# Altium footprint library PcbLib.PcbLib: 13 footprints
Each footprint in its own frame and in the unit in brackets; x right, y up, seen from the top. Pads: shape width x height; smd on the part's side, far side on the other; paste and mask are expansions set on the pad; w line width, h text height; cw(c..) or ccw(c..) is an arc to the next point about the centre after c.
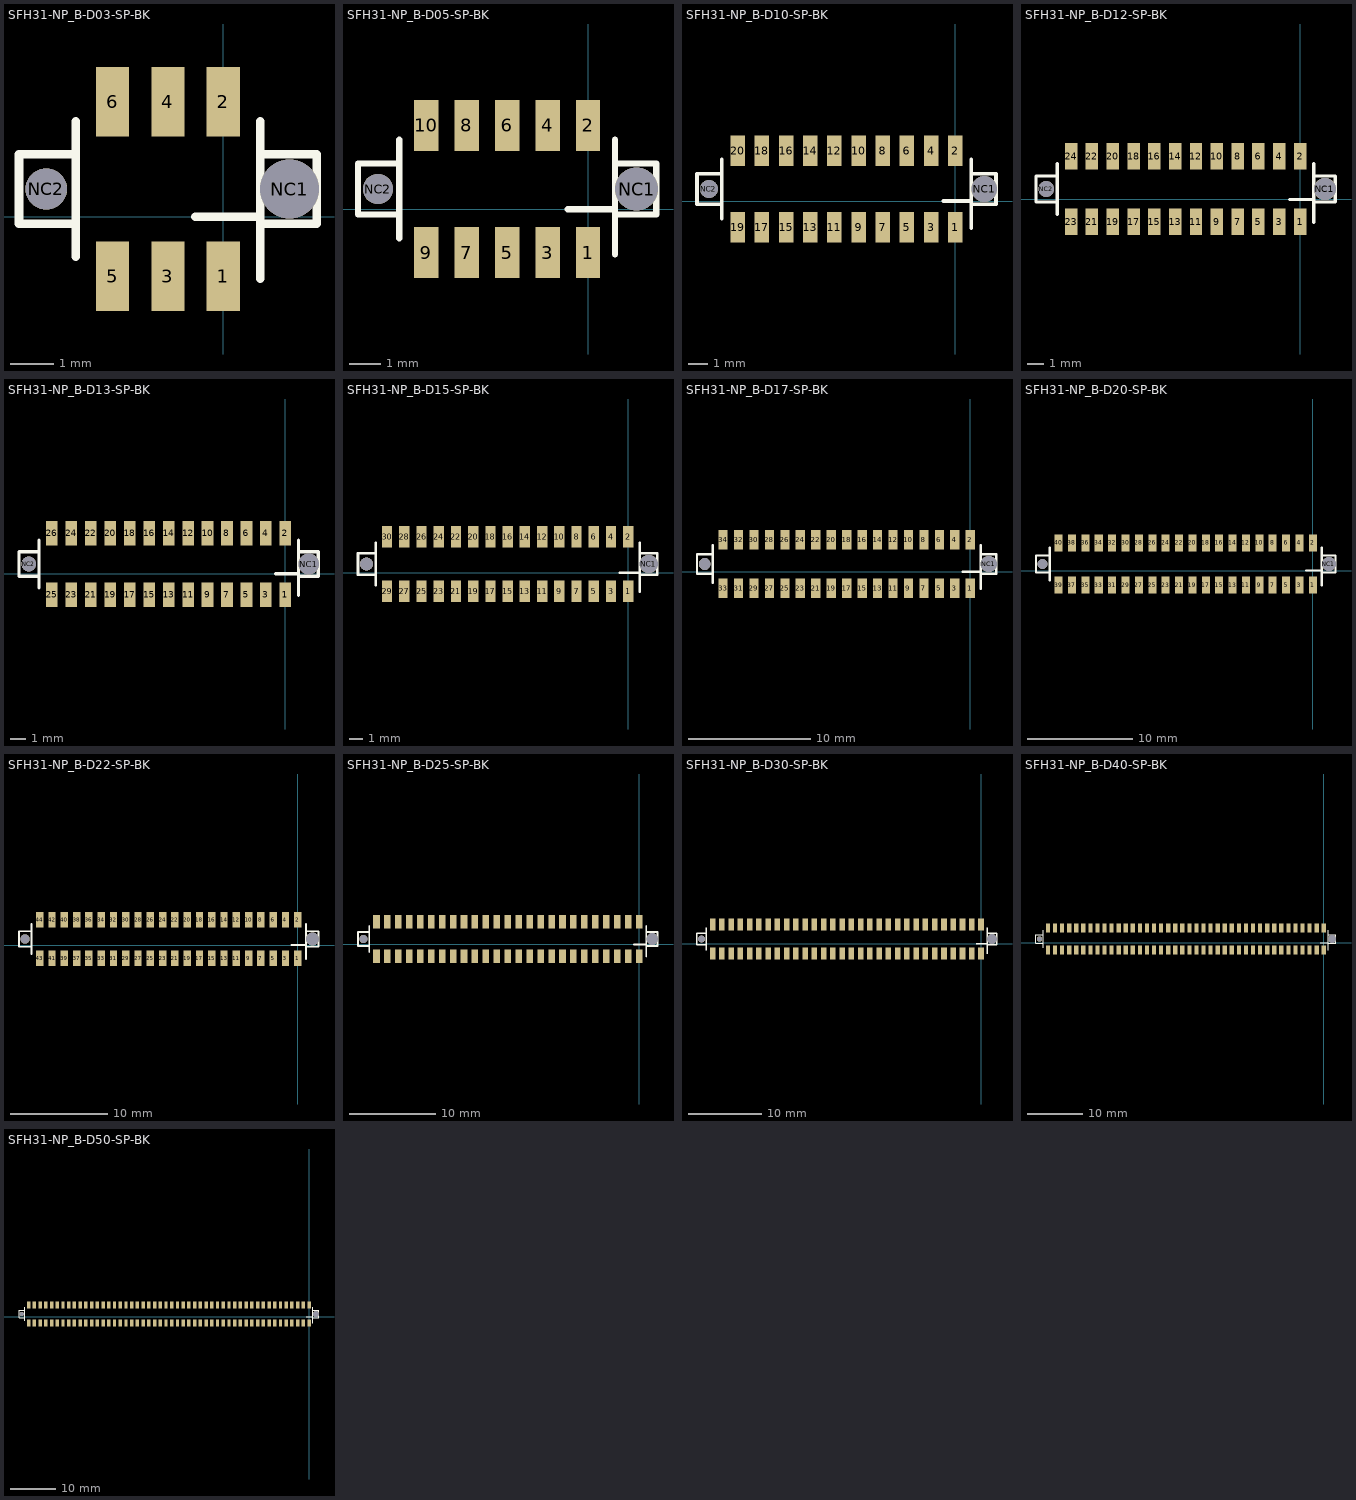
[diagram p0: the footprints below, top view; thin cyan lines are the x and y axes]

## SFH31-NP_B-D03-SP-BK [mm] "1.27mm SMT Female Header with Guide Posts & Polarizing Key"
height 4.4
pads (8):
  rect 0.76x1.6 smd: 1(0,-1.365) 2(0,2.635) 3(-1.27,-1.365) 4(-1.27,2.635) 5(-2.54,-1.365) 6(-2.54,2.635)
  round 1.35 hole 1.35 mask+0: NC1(1.52,0.635)
  round 0.95 hole 0.95 mask+0: NC2(-4.06,0.635)
via 1.52,0.635 diameter 1.35 hole 1.35
via -4.06,0.635 diameter 0.95 hole 0.95
Top Overlay:
  lines w0.2: -3.385,-0.915 -3.385,2.185 ; -3.385,-0.165 -4.685,-0.165 -4.685,1.435 -3.385,1.435 ; -0.635,0 0.845,0 ; 0.845,-1.415 0.845,2.185 ; 0.845,-0.165 2.145,-0.165 2.145,1.435 0.845,1.435
3D body "SFH31-_ _ _B-D03-SP-_ _.STEP": height 4.4, standoff -1, extent -4.715,-1.614 2.145,2.884

## SFH31-NP_B-D05-SP-BK [mm] "1.27mm SMT Female Header with Guide Posts & Polarizing Key"
height 4.4
pads (12):
  rect 0.76x1.6 smd: 1(0,-1.365) 2(0,2.635) 3(-1.27,-1.365) 4(-1.27,2.635) 5(-2.54,-1.365) 6(-2.54,2.635) 7(-3.81,-1.365) 8(-3.81,2.635) 9(-5.08,-1.365) 10(-5.08,2.635)
  round 1.35 hole 1.35 mask+0: NC1(1.52,0.635)
  round 0.95 hole 0.95 mask+0: NC2(-6.6,0.635)
via -6.6,0.635 diameter 0.95 hole 0.95
via 1.52,0.635 diameter 1.35 hole 1.35
Top Overlay:
  lines w0.2: -5.925,-0.915 -5.925,2.185 ; -5.925,-0.165 -7.225,-0.165 -7.225,1.435 -5.925,1.435 ; -0.635,0 0.845,0 ; 0.845,-1.415 0.845,2.185 ; 0.845,-0.165 2.145,-0.165 2.145,1.435 0.845,1.435

## SFH31-NP_B-D10-SP-BK [mm] "1.27mm SMT Female Header with Guide Posts & Polarizing Key"
height 4.4
pads (22):
  rect 0.76x1.6 smd: 1(0,-1.365) 2(0,2.635) 3(-1.27,-1.365) 4(-1.27,2.635) 5(-2.54,-1.365) 6(-2.54,2.635) 7(-3.81,-1.365) 8(-3.81,2.635) 9(-5.08,-1.365) 10(-5.08,2.635) 11(-6.35,-1.365) 12(-6.35,2.635) 13(-7.62,-1.365) 14(-7.62,2.635) 15(-8.89,-1.365) 16(-8.89,2.635) 17(-10.16,-1.365) 18(-10.16,2.635) 19(-11.43,-1.365) 20(-11.43,2.635)
  round 1.35 hole 1.35 mask+0: NC1(1.52,0.635)
  round 0.95 hole 0.95 mask+0: NC2(-12.95,0.635)
via -12.95,0.635 diameter 0.95 hole 0.95
via 1.52,0.635 diameter 1.35 hole 1.35
Top Overlay:
  lines w0.2: -12.275,-0.915 -12.275,2.185 ; -12.275,-0.165 -13.575,-0.165 -13.575,1.435 -12.275,1.435 ; -0.635,0 0.845,0 ; 0.845,-1.415 0.845,2.185 ; 0.845,-0.165 2.145,-0.165 2.145,1.435 0.845,1.435

## SFH31-NP_B-D12-SP-BK [mm] "1.27mm SMT Female Header with Guide Posts & Polarizing Key"
height 4.4
pads (26):
  rect 0.76x1.6 smd: 1(0,-1.365) 2(0,2.635) 3(-1.27,-1.365) 4(-1.27,2.635) 5(-2.54,-1.365) 6(-2.54,2.635) 7(-3.81,-1.365) 8(-3.81,2.635) 9(-5.08,-1.365) 10(-5.08,2.635) 11(-6.35,-1.365) 12(-6.35,2.635) 13(-7.62,-1.365) 14(-7.62,2.635) 15(-8.89,-1.365) 16(-8.89,2.635) 17(-10.16,-1.365) 18(-10.16,2.635) 19(-11.43,-1.365) 20(-11.43,2.635) 21(-12.7,-1.365) 22(-12.7,2.635) 23(-13.97,-1.365) 24(-13.97,2.635)
  round 1.35 hole 1.35 mask+0: NC1(1.52,0.635)
  round 0.95 hole 0.95 mask+0: NC2(-15.49,0.635)
via -15.49,0.635 diameter 0.95 hole 0.95
via 1.52,0.635 diameter 1.35 hole 1.35
Top Overlay:
  lines w0.2: -14.815,-0.915 -14.815,2.185 ; -14.815,-0.165 -16.115,-0.165 -16.115,1.435 -14.815,1.435 ; -0.635,0 0.845,0 ; 0.845,-1.415 0.845,2.185 ; 0.845,-0.165 2.145,-0.165 2.145,1.435 0.845,1.435

## SFH31-NP_B-D13-SP-BK [mm] "1.27mm SMT Female Header with Guide Posts & Polarizing Key"
height 4.4
pads (28):
  rect 0.76x1.6 smd: 1(0,-1.365) 2(0,2.635) 3(-1.27,-1.365) 4(-1.27,2.635) 5(-2.54,-1.365) 6(-2.54,2.635) 7(-3.81,-1.365) 8(-3.81,2.635) 9(-5.08,-1.365) 10(-5.08,2.635) 11(-6.35,-1.365) 12(-6.35,2.635) 13(-7.62,-1.365) 14(-7.62,2.635) 15(-8.89,-1.365) 16(-8.89,2.635) 17(-10.16,-1.365) 18(-10.16,2.635) 19(-11.43,-1.365) 20(-11.43,2.635) 21(-12.7,-1.365) 22(-12.7,2.635) 23(-13.97,-1.365) 24(-13.97,2.635) 25(-15.24,-1.365) 26(-15.24,2.635)
  round 1.35 hole 1.35 mask+0: NC1(1.52,0.635)
  round 0.95 hole 0.95 mask+0: NC2(-16.76,0.635)
via 1.52,0.635 diameter 1.35 hole 1.35
via -16.76,0.635 diameter 0.95 hole 0.95
Top Overlay:
  lines w0.2: -16.085,-0.915 -16.085,2.185 ; -16.085,-0.165 -17.385,-0.165 -17.385,1.435 -16.085,1.435 ; -0.635,0 0.845,0 ; 0.845,-1.415 0.845,2.185 ; 0.845,-0.165 2.145,-0.165 2.145,1.435 0.845,1.435
3D body "SFH31-_ _ _B-D13-SP-_ _.STEP": height 4.4, standoff -1, extent -17.415,-1.614 2.145,2.884

## SFH31-NP_B-D15-SP-BK [mm] "1.27mm SMT Female Header with Guide Posts & Polarizing Key"
height 4.4
pads (32):
  rect 0.76x1.6 smd: 1(0,-1.365) 2(0,2.635) 3(-1.27,-1.365) 4(-1.27,2.635) 5(-2.54,-1.365) 6(-2.54,2.635) 7(-3.81,-1.365) 8(-3.81,2.635) 9(-5.08,-1.365) 10(-5.08,2.635) 11(-6.35,-1.365) 12(-6.35,2.635) 13(-7.62,-1.365) 14(-7.62,2.635) 15(-8.89,-1.365) 16(-8.89,2.635) 17(-10.16,-1.365) 18(-10.16,2.635) 19(-11.43,-1.365) 20(-11.43,2.635) 21(-12.7,-1.365) 22(-12.7,2.635) 23(-13.97,-1.365) 24(-13.97,2.635) 25(-15.24,-1.365) 26(-15.24,2.635) 27(-16.51,-1.365) 28(-16.51,2.635) 29(-17.78,-1.365) 30(-17.78,2.635)
  round 1.35 hole 1.35 mask+0: NC1(1.52,0.635)
  round 0.95 hole 0.95 mask+0: NC2(-19.3,0.635)
via 1.52,0.635 diameter 1.35 hole 1.35
via -19.3,0.635 diameter 0.95 hole 0.95
Top Overlay:
  lines w0.2: -18.625,-0.915 -18.625,2.185 ; -18.625,-0.165 -19.925,-0.165 -19.925,1.435 -18.625,1.435 ; -0.635,0 0.845,0 ; 0.845,-1.415 0.845,2.185 ; 0.845,-0.165 2.145,-0.165 2.145,1.435 0.845,1.435

## SFH31-NP_B-D17-SP-BK [mm] "1.27mm SMT Female Header with Guide Posts & Polarizing Key"
height 4.4
pads (36):
  rect 0.76x1.6 smd: 1(0,-1.365) 2(0,2.635) 3(-1.27,-1.365) 4(-1.27,2.635) 5(-2.54,-1.365) 6(-2.54,2.635) 7(-3.81,-1.365) 8(-3.81,2.635) 9(-5.08,-1.365) 10(-5.08,2.635) 11(-6.35,-1.365) 12(-6.35,2.635) 13(-7.62,-1.365) 14(-7.62,2.635) 15(-8.89,-1.365) 16(-8.89,2.635) 17(-10.16,-1.365) 18(-10.16,2.635) 19(-11.43,-1.365) 20(-11.43,2.635) 21(-12.7,-1.365) 22(-12.7,2.635) 23(-13.97,-1.365) 24(-13.97,2.635) 25(-15.24,-1.365) 26(-15.24,2.635) 27(-16.51,-1.365) 28(-16.51,2.635) 29(-17.78,-1.365) 30(-17.78,2.635) 31(-19.05,-1.365) 32(-19.05,2.635) 33(-20.32,-1.365) 34(-20.32,2.635)
  round 1.35 hole 1.35 mask+0: NC1(1.52,0.635)
  round 0.95 hole 0.95 mask+0: NC2(-21.84,0.635)
via -21.84,0.635 diameter 0.95 hole 0.95
via 1.52,0.635 diameter 1.35 hole 1.35
Top Overlay:
  lines w0.2: -21.165,-0.915 -21.165,2.185 ; -21.165,-0.165 -22.465,-0.165 -22.465,1.435 -21.165,1.435 ; -0.635,0 0.845,0 ; 0.845,-1.415 0.845,2.185 ; 0.845,-0.165 2.145,-0.165 2.145,1.435 0.845,1.435
3D body "SFH31-_ _ _B-D17-SP-_ _.STEP": height 4.4, standoff -1, extent -22.495,-1.614 2.145,2.884

## SFH31-NP_B-D20-SP-BK [mm] "1.27mm SMT Female Header with Guide Posts & Polarizing Key"
height 4.4
pads (42):
  rect 0.76x1.6 smd: 1(0,-1.365) 2(0,2.635) 3(-1.27,-1.365) 4(-1.27,2.635) 5(-2.54,-1.365) 6(-2.54,2.635) 7(-3.81,-1.365) 8(-3.81,2.635) 9(-5.08,-1.365) 10(-5.08,2.635) 11(-6.35,-1.365) 12(-6.35,2.635) 13(-7.62,-1.365) 14(-7.62,2.635) 15(-8.89,-1.365) 16(-8.89,2.635) 17(-10.16,-1.365) 18(-10.16,2.635) 19(-11.43,-1.365) 20(-11.43,2.635) 21(-12.7,-1.365) 22(-12.7,2.635) 23(-13.97,-1.365) 24(-13.97,2.635) 25(-15.24,-1.365) 26(-15.24,2.635) 27(-16.51,-1.365) 28(-16.51,2.635) 29(-17.78,-1.365) 30(-17.78,2.635) 31(-19.05,-1.365) 32(-19.05,2.635) 33(-20.32,-1.365) 34(-20.32,2.635) 35(-21.59,-1.365) 36(-21.59,2.635) 37(-22.86,-1.365) 38(-22.86,2.635) 39(-24.13,-1.365) 40(-24.13,2.635)
  round 1.35 hole 1.35 mask+0: NC1(1.52,0.635)
  round 0.95 hole 0.95 mask+0: NC2(-25.65,0.635)
via 1.52,0.635 diameter 1.35 hole 1.35
via -25.65,0.635 diameter 0.95 hole 0.95
Top Overlay:
  lines w0.2: -24.975,-0.915 -24.975,2.185 ; -24.975,-0.165 -26.275,-0.165 -26.275,1.435 -24.975,1.435 ; -0.635,0 0.845,0 ; 0.845,-1.415 0.845,2.185 ; 0.845,-0.165 2.145,-0.165 2.145,1.435 0.845,1.435

## SFH31-NP_B-D22-SP-BK [mm] "1.27mm SMT Female Header with Guide Posts & Polarizing Key"
height 4.4
pads (46):
  rect 0.76x1.6 smd: 1(0,-1.365) 2(0,2.635) 3(-1.27,-1.365) 4(-1.27,2.635) 5(-2.54,-1.365) 6(-2.54,2.635) 7(-3.81,-1.365) 8(-3.81,2.635) 9(-5.08,-1.365) 10(-5.08,2.635) 11(-6.35,-1.365) 12(-6.35,2.635) 13(-7.62,-1.365) 14(-7.62,2.635) 15(-8.89,-1.365) 16(-8.89,2.635) 17(-10.16,-1.365) 18(-10.16,2.635) 19(-11.43,-1.365) 20(-11.43,2.635) 21(-12.7,-1.365) 22(-12.7,2.635) 23(-13.97,-1.365) 24(-13.97,2.635) 25(-15.24,-1.365) 26(-15.24,2.635) 27(-16.51,-1.365) 28(-16.51,2.635) 29(-17.78,-1.365) 30(-17.78,2.635) 31(-19.05,-1.365) 32(-19.05,2.635) 33(-20.32,-1.365) 34(-20.32,2.635) 35(-21.59,-1.365) 36(-21.59,2.635) 37(-22.86,-1.365) 38(-22.86,2.635) 39(-24.13,-1.365) 40(-24.13,2.635) 41(-25.4,-1.365) 42(-25.4,2.635) 43(-26.67,-1.365) 44(-26.67,2.635)
  round 1.35 hole 1.35 mask+0: NC1(1.52,0.635)
  round 0.95 hole 0.95 mask+0: NC2(-28.19,0.635)
via 1.52,0.635 diameter 1.35 hole 1.35
via -28.19,0.635 diameter 0.95 hole 0.95
Top Overlay:
  lines w0.2: -27.515,-0.915 -27.515,2.185 ; -27.515,-0.165 -28.815,-0.165 -28.815,1.435 -27.515,1.435 ; -0.635,0 0.845,0 ; 0.845,-1.415 0.845,2.185 ; 0.845,-0.165 2.145,-0.165 2.145,1.435 0.845,1.435

## SFH31-NP_B-D25-SP-BK [mm] "1.27mm SMT Female Header with Guide Posts & Polarizing Key"
height 4.4
pads (52):
  rect 0.76x1.6 smd: 1(0,-1.365) 2(0,2.635) 3(-1.27,-1.365) 4(-1.27,2.635) 5(-2.54,-1.365) 6(-2.54,2.635) 7(-3.81,-1.365) 8(-3.81,2.635) 9(-5.08,-1.365) 10(-5.08,2.635) 11(-6.35,-1.365) 12(-6.35,2.635) 13(-7.62,-1.365) 14(-7.62,2.635) 15(-8.89,-1.365) 16(-8.89,2.635) 17(-10.16,-1.365) 18(-10.16,2.635) 19(-11.43,-1.365) 20(-11.43,2.635) 21(-12.7,-1.365) 22(-12.7,2.635) 23(-13.97,-1.365) 24(-13.97,2.635) 25(-15.24,-1.365) 26(-15.24,2.635) 27(-16.51,-1.365) 28(-16.51,2.635) 29(-17.78,-1.365) 30(-17.78,2.635) 31(-19.05,-1.365) 32(-19.05,2.635) 33(-20.32,-1.365) 34(-20.32,2.635) 35(-21.59,-1.365) 36(-21.59,2.635) 37(-22.86,-1.365) 38(-22.86,2.635) 39(-24.13,-1.365) 40(-24.13,2.635) 41(-25.4,-1.365) 42(-25.4,2.635) 43(-26.67,-1.365) 44(-26.67,2.635) 45(-27.94,-1.365) 46(-27.94,2.635) 47(-29.21,-1.365) 48(-29.21,2.635) 49(-30.48,-1.365) 50(-30.48,2.635)
  round 1.35 hole 1.35 mask+0: NC1(1.52,0.635)
  round 0.95 hole 0.95 mask+0: NC2(-32,0.635)
via 1.52,0.635 diameter 1.35 hole 1.35
via -32,0.635 diameter 0.95 hole 0.95
Top Overlay:
  lines w0.2: -31.325,-0.915 -31.325,2.185 ; -31.325,-0.165 -32.625,-0.165 -32.625,1.435 -31.325,1.435 ; -0.635,0 0.845,0 ; 0.845,-1.415 0.845,2.185 ; 0.845,-0.165 2.145,-0.165 2.145,1.435 0.845,1.435

## SFH31-NP_B-D30-SP-BK [mm] "1.27mm SMT Female Header with Guide Posts & Polarizing Key"
height 4.4
pads (62):
  rect 0.76x1.6 smd: 1(0,-1.365) 2(0,2.635) 3(-1.27,-1.365) 4(-1.27,2.635) 5(-2.54,-1.365) 6(-2.54,2.635) 7(-3.81,-1.365) 8(-3.81,2.635) 9(-5.08,-1.365) 10(-5.08,2.635) 11(-6.35,-1.365) 12(-6.35,2.635) 13(-7.62,-1.365) 14(-7.62,2.635) 15(-8.89,-1.365) 16(-8.89,2.635) 17(-10.16,-1.365) 18(-10.16,2.635) 19(-11.43,-1.365) 20(-11.43,2.635) 21(-12.7,-1.365) 22(-12.7,2.635) 23(-13.97,-1.365) 24(-13.97,2.635) 25(-15.24,-1.365) 26(-15.24,2.635) 27(-16.51,-1.365) 28(-16.51,2.635) 29(-17.78,-1.365) 30(-17.78,2.635) 31(-19.05,-1.365) 32(-19.05,2.635) 33(-20.32,-1.365) 34(-20.32,2.635) 35(-21.59,-1.365) 36(-21.59,2.635) 37(-22.86,-1.365) 38(-22.86,2.635) 39(-24.13,-1.365) 40(-24.13,2.635) 41(-25.4,-1.365) 42(-25.4,2.635) 43(-26.67,-1.365) 44(-26.67,2.635) 45(-27.94,-1.365) 46(-27.94,2.635) 47(-29.21,-1.365) 48(-29.21,2.635) 49(-30.48,-1.365) 50(-30.48,2.635) 51(-31.75,-1.365) 52(-31.75,2.635) 53(-33.02,-1.365) 54(-33.02,2.635) 55(-34.29,-1.365) 56(-34.29,2.635) 57(-35.56,-1.365) 58(-35.56,2.635) 59(-36.83,-1.365) 60(-36.83,2.635)
  round 1.35 hole 1.35 mask+0: NC1(1.52,0.635)
  round 0.95 hole 0.95 mask+0: NC2(-38.35,0.635)
via -38.35,0.635 diameter 0.95 hole 0.95
via 1.52,0.635 diameter 1.35 hole 1.35
Top Overlay:
  lines w0.2: -37.675,-0.915 -37.675,2.185 ; -37.675,-0.165 -38.975,-0.165 -38.975,1.435 -37.675,1.435 ; -0.635,0 0.845,0 ; 0.845,-1.415 0.845,2.185 ; 0.845,-0.165 2.145,-0.165 2.145,1.435 0.845,1.435

## SFH31-NP_B-D40-SP-BK [mm] "1.27mm SMT Female Header with Guide Posts & Polarizing Key"
height 4.4
pads (82):
  rect 0.76x1.6 smd: 1(0,-1.365) 2(0,2.635) 3(-1.27,-1.365) 4(-1.27,2.635) 5(-2.54,-1.365) 6(-2.54,2.635) 7(-3.81,-1.365) 8(-3.81,2.635) 9(-5.08,-1.365) 10(-5.08,2.635) 11(-6.35,-1.365) 12(-6.35,2.635) 13(-7.62,-1.365) 14(-7.62,2.635) 15(-8.89,-1.365) 16(-8.89,2.635) 17(-10.16,-1.365) 18(-10.16,2.635) 19(-11.43,-1.365) 20(-11.43,2.635) 21(-12.7,-1.365) 22(-12.7,2.635) 23(-13.97,-1.365) 24(-13.97,2.635) 25(-15.24,-1.365) 26(-15.24,2.635) 27(-16.51,-1.365) 28(-16.51,2.635) 29(-17.78,-1.365) 30(-17.78,2.635) 31(-19.05,-1.365) 32(-19.05,2.635) 33(-20.32,-1.365) 34(-20.32,2.635) 35(-21.59,-1.365) 36(-21.59,2.635) 37(-22.86,-1.365) 38(-22.86,2.635) 39(-24.13,-1.365) 40(-24.13,2.635) 41(-25.4,-1.365) 42(-25.4,2.635) 43(-26.67,-1.365) 44(-26.67,2.635) 45(-27.94,-1.365) 46(-27.94,2.635) 47(-29.21,-1.365) 48(-29.21,2.635) 49(-30.48,-1.365) 50(-30.48,2.635) 51(-31.75,-1.365) 52(-31.75,2.635) 53(-33.02,-1.365) 54(-33.02,2.635) 55(-34.29,-1.365) 56(-34.29,2.635) 57(-35.56,-1.365) 58(-35.56,2.635) 59(-36.83,-1.365) 60(-36.83,2.635) 61(-38.1,-1.365) 62(-38.1,2.635) 63(-39.37,-1.365) 64(-39.37,2.635) 65(-40.64,-1.365) 66(-40.64,2.635) 67(-41.91,-1.365) 68(-41.91,2.635) 69(-43.18,-1.365) 70(-43.18,2.635) 71(-44.45,-1.365) 72(-44.45,2.635) 73(-45.72,-1.365) 74(-45.72,2.635) 75(-46.99,-1.365) 76(-46.99,2.635) 77(-48.26,-1.365) 78(-48.26,2.635) 79(-49.53,-1.365) 80(-49.53,2.635)
  round 1.35 hole 1.35 mask+0: NC1(1.52,0.635)
  round 0.95 hole 0.95 mask+0: NC2(-51.05,0.635)
via 1.52,0.635 diameter 1.35 hole 1.35
via -51.05,0.635 diameter 0.95 hole 0.95
Top Overlay:
  lines w0.2: -50.375,-0.915 -50.375,2.185 ; -50.375,-0.165 -51.675,-0.165 -51.675,1.435 -50.375,1.435 ; -0.635,0 0.845,0 ; 0.845,-1.415 0.845,2.185 ; 0.845,-0.165 2.145,-0.165 2.145,1.435 0.845,1.435

## SFH31-NP_B-D50-SP-BK [mm] "1.27mm SMT Female Header with Guide Posts & Polarizing Key"
height 4.4
pads (102):
  rect 0.76x1.6 smd: 1(0,-1.365) 2(0,2.635) 3(-1.27,-1.365) 4(-1.27,2.635) 5(-2.54,-1.365) 6(-2.54,2.635) 7(-3.81,-1.365) 8(-3.81,2.635) 9(-5.08,-1.365) 10(-5.08,2.635) 11(-6.35,-1.365) 12(-6.35,2.635) 13(-7.62,-1.365) 14(-7.62,2.635) 15(-8.89,-1.365) 16(-8.89,2.635) 17(-10.16,-1.365) 18(-10.16,2.635) 19(-11.43,-1.365) 20(-11.43,2.635) 21(-12.7,-1.365) 22(-12.7,2.635) 23(-13.97,-1.365) 24(-13.97,2.635) 25(-15.24,-1.365) 26(-15.24,2.635) 27(-16.51,-1.365) 28(-16.51,2.635) 29(-17.78,-1.365) 30(-17.78,2.635) 31(-19.05,-1.365) 32(-19.05,2.635) 33(-20.32,-1.365) 34(-20.32,2.635) 35(-21.59,-1.365) 36(-21.59,2.635) 37(-22.86,-1.365) 38(-22.86,2.635) 39(-24.13,-1.365) 40(-24.13,2.635) 41(-25.4,-1.365) 42(-25.4,2.635) 43(-26.67,-1.365) 44(-26.67,2.635) 45(-27.94,-1.365) 46(-27.94,2.635) 47(-29.21,-1.365) 48(-29.21,2.635) 49(-30.48,-1.365) 50(-30.48,2.635) 51(-31.75,-1.365) 52(-31.75,2.635) 53(-33.02,-1.365) 54(-33.02,2.635) 55(-34.29,-1.365) 56(-34.29,2.635) 57(-35.56,-1.365) 58(-35.56,2.635) 59(-36.83,-1.365) 60(-36.83,2.635) 61(-38.1,-1.365) 62(-38.1,2.635) 63(-39.37,-1.365) 64(-39.37,2.635) 65(-40.64,-1.365) 66(-40.64,2.635) 67(-41.91,-1.365) 68(-41.91,2.635) 69(-43.18,-1.365) 70(-43.18,2.635) 71(-44.45,-1.365) 72(-44.45,2.635) 73(-45.72,-1.365) 74(-45.72,2.635) 75(-46.99,-1.365) 76(-46.99,2.635) 77(-48.26,-1.365) 78(-48.26,2.635) 79(-49.53,-1.365) 80(-49.53,2.635) 81(-50.8,-1.365) 82(-50.8,2.635) 83(-52.07,-1.365) 84(-52.07,2.635) 85(-53.34,-1.365) 86(-53.34,2.635) 87(-54.61,-1.365) 88(-54.61,2.635) 89(-55.88,-1.365) 90(-55.88,2.635) 91(-57.15,-1.365) 92(-57.15,2.635) 93(-58.42,-1.365) 94(-58.42,2.635) 95(-59.69,-1.365) 96(-59.69,2.635) 97(-60.96,-1.365) 98(-60.96,2.635) 99(-62.23,-1.365) 100(-62.23,2.635)
  round 1.35 hole 1.35 mask+0: NC1(1.52,0.635)
  round 0.95 hole 0.95 mask+0: NC2(-63.75,0.635)
via -63.75,0.635 diameter 0.95 hole 0.95
via 1.52,0.635 diameter 1.35 hole 1.35
Top Overlay:
  lines w0.2: -63.075,-0.915 -63.075,2.185 ; -63.075,-0.165 -64.375,-0.165 -64.375,1.435 -63.075,1.435 ; -0.635,0 0.845,0 ; 0.845,-1.415 0.845,2.185 ; 0.845,-0.165 2.145,-0.165 2.145,1.435 0.845,1.435
3D body "SFH31-_ _ _B-D50-SP-_ _.STEP": height 4.4, standoff -1, extent -64.405,-1.614 2.145,2.884